# Altium footprint library CONN_HDR_1.27MM_ST.PcbLib: 116 footprints (part 6 of 9)
Each footprint in its own frame and in the unit in brackets; x right, y up, seen from the top. Pads: shape width x height; smd on the part's side, far side on the other; paste and mask are expansions set on the pad; w line width, h text height; cw(c..) or ccw(c..) is an arc to the next point about the centre after c.
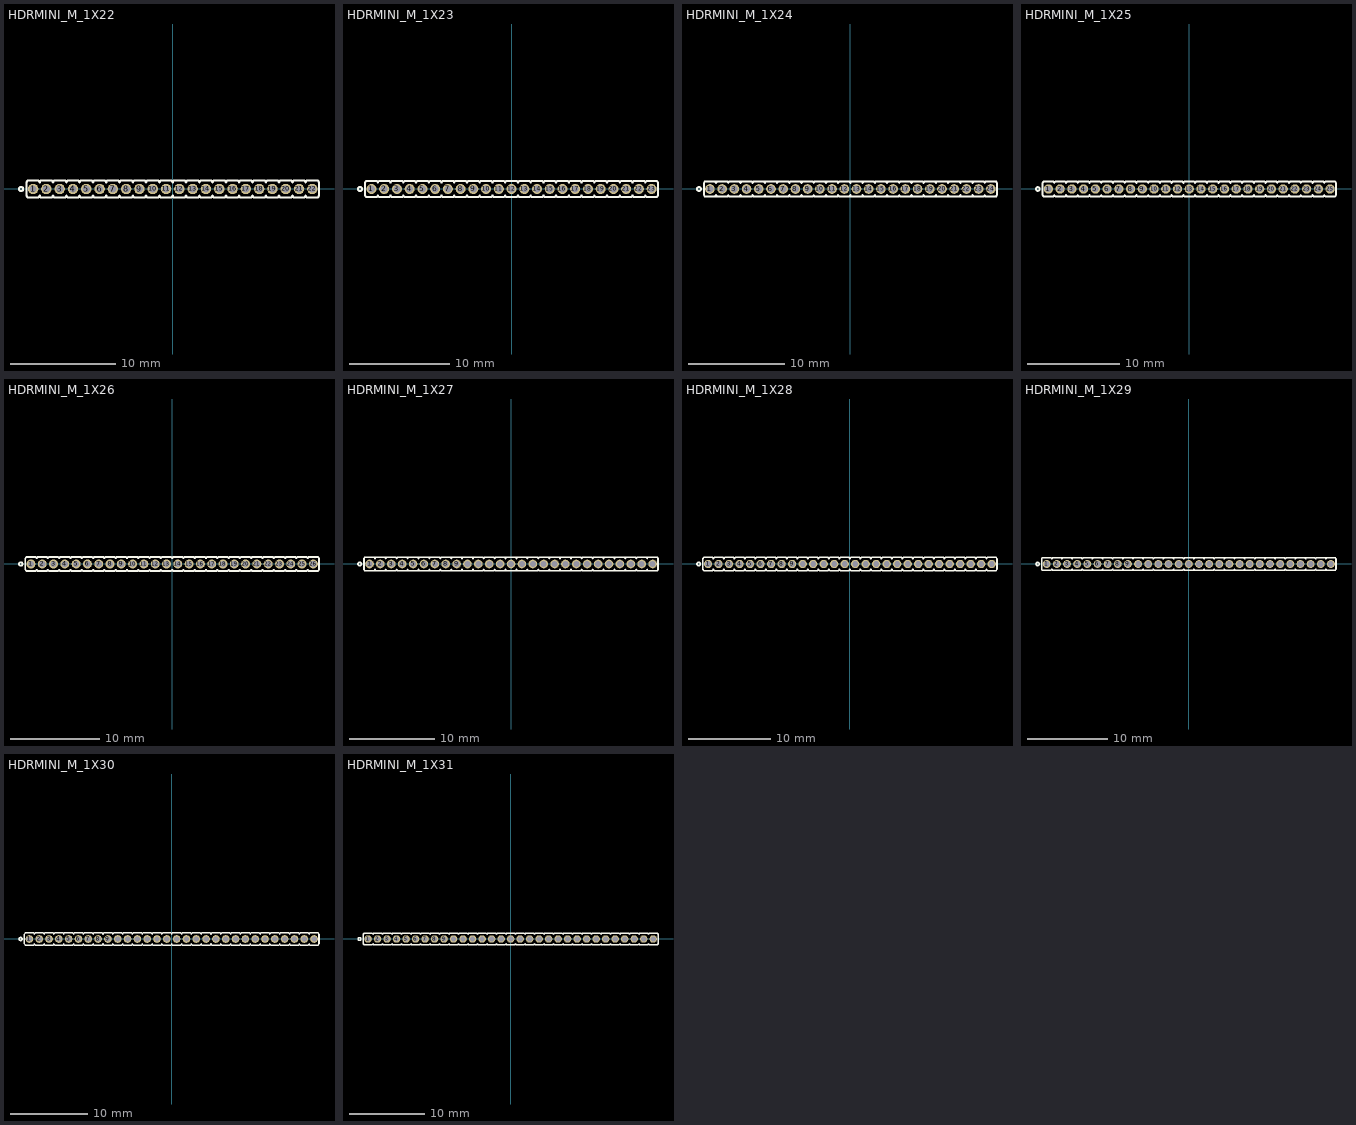
[diagram p5: the footprints below, top view; thin cyan lines are the x and y axes]

## HDRMINI_M_1X22 [mm] "mini header (50mil pitch)"
pads (22):
  round 1 / inner round 1 / far side oval 1x1.4 hole 0.7 mask+0.05: 1(-13.335,0) 2(-12.065,0) 3(-10.795,0) 4(-9.525,0) 5(-8.255,0) 6(-6.985,0) 7(-5.715,0) 8(-4.445,0) 9(-3.175,0) 10(-1.905,0) 11(-0.635,0) 12(0.635,0) 13(1.905,0) 14(3.175,0) 15(4.445,0) 16(5.715,0) 17(6.985,0) 18(8.255,0) 19(9.525,0) 20(10.795,0) 21(12.065,0) 22(13.335,0)
Top Overlay:
  circle w0.2: c-14.478,0 r0.2
  lines w0.2: 12.701,-0.635 12.602,-0.8 11.53,-0.8 11.431,-0.635 11.332,-0.8 10.26,-0.8 10.161,-0.635 10.062,-0.8 8.99,-0.8 8.891,-0.635 8.792,-0.8 7.72,-0.8 7.621,-0.635 7.522,-0.8 6.45,-0.8 6.351,-0.635 6.252,-0.8 5.18,-0.8 5.081,-0.635 4.982,-0.8 3.91,-0.8 3.811,-0.635 3.712,-0.8 2.64,-0.8 2.541,-0.635 2.442,-0.8 1.37,-0.8 1.271,-0.635 1.172,-0.8 0.1,-0.8 0.001,-0.635 -0.099,-0.8 -1.171,-0.8 -1.27,-0.635 -1.369,-0.8 -2.441,-0.8 -2.54,-0.635 -2.639,-0.8 -3.711,-0.8 -3.81,-0.635 -3.909,-0.8 -4.981,-0.8 -5.08,-0.635 -5.179,-0.8 -6.251,-0.8 -6.35,-0.635 -6.449,-0.8 -7.521,-0.8 -7.62,-0.635 -7.719,-0.8 -8.791,-0.8 -8.89,-0.635 -8.989,-0.8 -10.061,-0.8 -10.16,-0.635 -10.259,-0.8 -11.331,-0.8 -11.43,-0.635 -11.529,-0.8 -12.601,-0.8 -12.7,-0.635 -12.799,-0.8 -13.871,-0.8 -13.97,-0.635 -13.97,0.635 -13.871,0.8 -12.799,0.8 -12.7,0.635 -12.601,0.8 -11.529,0.8 -11.43,0.635 -11.331,0.8 -10.259,0.8 -10.16,0.635 -10.061,0.8 -8.989,0.8 -8.89,0.635 -8.791,0.8 -7.719,0.8 -7.62,0.635 -7.521,0.8 -6.449,0.8 -6.35,0.635 -6.251,0.8 -5.179,0.8 -5.08,0.635 -4.981,0.8 -3.909,0.8 -3.81,0.635 -3.711,0.8 -2.639,0.8 -2.54,0.635 -2.441,0.8 -1.369,0.8 -1.27,0.635 -1.171,0.8 -0.099,0.8 0,0.635 0.1,0.8 1.172,0.8 1.271,0.635 1.37,0.8 2.442,0.8 2.541,0.635 2.64,0.8 3.712,0.8 3.811,0.635 3.91,0.8 4.982,0.8 5.081,0.635 5.18,0.8 6.252,0.8 6.351,0.635 6.45,0.8 7.522,0.8 7.621,0.635 7.72,0.8 8.792,0.8 8.891,0.635 8.99,0.8 10.062,0.8 10.161,0.635 10.26,0.8 11.332,0.8 11.431,0.635 11.53,0.8 12.602,0.8 12.701,0.635 ; 12.701,-0.635 12.8,-0.8 13.872,-0.8 13.971,-0.635 13.971,0.635 13.872,0.8 12.8,0.8 12.701,0.635
3D body: height 2.8, standoff 0, extent -3.81,-0.635 -2.54,0.635
3D body: height 7.3, standoff -2.5, extent -3.375,-0.2 -2.975,0.2
3D body: height 2.8, standoff 0, extent -5.08,-0.635 -3.81,0.635
3D body: height 7.3, standoff -2.5, extent -4.645,-0.2 -4.245,0.2
3D body: height 2.8, standoff 0, extent -6.35,-0.635 -5.08,0.635
3D body: height 7.3, standoff -2.5, extent -5.915,-0.2 -5.515,0.2
3D body: height 2.8, standoff 0, extent -7.62,-0.635 -6.35,0.635
3D body: height 7.3, standoff -2.5, extent -7.185,-0.2 -6.785,0.2
3D body: height 2.8, standoff 0, extent -8.89,-0.635 -7.62,0.635
3D body: height 7.3, standoff -2.5, extent -8.455,-0.2 -8.055,0.2
3D body: height 2.8, standoff 0, extent -10.16,-0.635 -8.89,0.635
3D body: height 7.3, standoff -2.5, extent -9.725,-0.2 -9.325,0.2
3D body: height 2.8, standoff 0, extent -11.43,-0.635 -10.16,0.635
3D body: height 7.3, standoff -2.5, extent -10.995,-0.2 -10.595,0.2
3D body: height 2.8, standoff 0, extent -12.7,-0.635 -11.43,0.635
3D body: height 7.3, standoff -2.5, extent -12.265,-0.2 -11.865,0.2
3D body: height 2.8, standoff 0, extent -13.97,-0.635 -12.7,0.635
3D body: height 7.3, standoff -2.5, extent -13.535,-0.2 -13.135,0.2
3D body: height 2.8, standoff 0, extent -2.54,-0.635 -1.27,0.635
3D body: height 7.3, standoff -2.5, extent -2.105,-0.2 -1.705,0.2
3D body: height 2.8, standoff 0, extent 8.89,-0.635 10.16,0.635
3D body: height 7.3, standoff -2.5, extent 9.325,-0.2 9.725,0.2
3D body: height 2.8, standoff 0, extent 7.62,-0.635 8.89,0.635
3D body: height 7.3, standoff -2.5, extent 8.055,-0.2 8.455,0.2
3D body: height 2.8, standoff 0, extent 6.35,-0.635 7.62,0.635
3D body: height 7.3, standoff -2.5, extent 6.785,-0.2 7.185,0.2
3D body: height 2.8, standoff 0, extent 5.08,-0.635 6.35,0.635
3D body: height 7.3, standoff -2.5, extent 5.515,-0.2 5.915,0.2
3D body: height 2.8, standoff 0, extent 3.81,-0.635 5.08,0.635
3D body: height 7.3, standoff -2.5, extent 4.245,-0.2 4.645,0.2
3D body: height 2.8, standoff 0, extent 2.54,-0.635 3.81,0.635
3D body: height 7.3, standoff -2.5, extent 2.975,-0.2 3.375,0.2
3D body: height 2.8, standoff 0, extent 1.27,-0.635 2.54,0.635
3D body: height 7.3, standoff -2.5, extent 1.705,-0.2 2.105,0.2
3D body: height 2.8, standoff 0, extent 0,-0.635 1.27,0.635
3D body: height 7.3, standoff -2.5, extent 0.435,-0.2 0.835,0.2
3D body: height 2.8, standoff 0, extent -1.27,-0.635 0,0.635
3D body: height 7.3, standoff -2.5, extent -0.835,-0.2 -0.435,0.2
3D body: height 2.8, standoff 0, extent 10.16,-0.635 11.43,0.635
3D body: height 7.3, standoff -2.5, extent 10.595,-0.2 10.995,0.2
3D body: height 2.8, standoff 0, extent 12.7,-0.635 13.97,0.635
3D body: height 7.3, standoff -2.5, extent 13.135,-0.2 13.535,0.2
3D body: height 2.8, standoff 0, extent 11.43,-0.635 12.7,0.635
3D body: height 7.3, standoff -2.5, extent 11.865,-0.2 12.265,0.2

## HDRMINI_M_1X23 [mm] "mini header (50mil pitch)"
pads (23):
  round 1 / inner round 1 / far side oval 1x1.4 hole 0.7 mask+0.05: 1(-13.97,0) 2(-12.7,0) 3(-11.43,0) 4(-10.16,0) 5(-8.89,0) 6(-7.62,0) 7(-6.35,0) 8(-5.08,0) 9(-3.81,0) 10(-2.54,0) 11(-1.27,0) 12(0,0) 13(1.27,0) 14(2.54,0) 15(3.81,0) 16(5.08,0) 17(6.35,0) 18(7.62,0) 19(8.89,0) 20(10.16,0) 21(11.43,0) 22(12.7,0) 23(13.97,0)
Top Overlay:
  circle w0.2: c-15.113,0 r0.2
  lines w0.2: 12.066,-0.635 11.967,-0.8 10.895,-0.8 10.796,-0.635 10.697,-0.8 9.625,-0.8 9.526,-0.635 9.427,-0.8 8.355,-0.8 8.256,-0.635 8.157,-0.8 7.085,-0.8 6.986,-0.635 6.887,-0.8 5.815,-0.8 5.716,-0.635 5.617,-0.8 4.545,-0.8 4.446,-0.635 4.347,-0.8 3.275,-0.8 3.176,-0.635 3.077,-0.8 2.005,-0.8 1.906,-0.635 1.807,-0.8 0.735,-0.8 0.636,-0.635 0.537,-0.8 -0.535,-0.8 -0.634,-0.635 -0.734,-0.8 -1.806,-0.8 -1.905,-0.635 -2.004,-0.8 -3.076,-0.8 -3.175,-0.635 -3.274,-0.8 -4.346,-0.8 -4.445,-0.635 -4.544,-0.8 -5.616,-0.8 -5.715,-0.635 -5.814,-0.8 -6.886,-0.8 -6.985,-0.635 -7.084,-0.8 -8.156,-0.8 -8.255,-0.635 -8.354,-0.8 -9.426,-0.8 -9.525,-0.635 -9.624,-0.8 -10.696,-0.8 -10.795,-0.635 -10.894,-0.8 -11.966,-0.8 -12.065,-0.635 -12.164,-0.8 -13.236,-0.8 -13.335,-0.635 -13.434,-0.8 -14.506,-0.8 -14.605,-0.635 -14.605,0.635 -14.506,0.8 -13.434,0.8 -13.335,0.635 -13.236,0.8 -12.164,0.8 -12.065,0.635 -11.966,0.8 -10.894,0.8 -10.795,0.635 -10.696,0.8 -9.624,0.8 -9.525,0.635 -9.426,0.8 -8.354,0.8 -8.255,0.635 -8.156,0.8 -7.084,0.8 -6.985,0.635 -6.886,0.8 -5.814,0.8 -5.715,0.635 -5.616,0.8 -4.544,0.8 -4.445,0.635 -4.346,0.8 -3.274,0.8 -3.175,0.635 -3.076,0.8 -2.004,0.8 -1.905,0.635 -1.806,0.8 -0.734,0.8 -0.635,0.635 -0.535,0.8 0.537,0.8 0.636,0.635 0.735,0.8 1.807,0.8 1.906,0.635 2.005,0.8 3.077,0.8 3.176,0.635 3.275,0.8 4.347,0.8 4.446,0.635 4.545,0.8 5.617,0.8 5.716,0.635 5.815,0.8 6.887,0.8 6.986,0.635 7.085,0.8 8.157,0.8 8.256,0.635 8.355,0.8 9.427,0.8 9.526,0.635 9.625,0.8 10.697,0.8 10.796,0.635 10.895,0.8 11.967,0.8 12.066,0.635 ; 12.066,-0.635 12.165,-0.8 13.237,-0.8 13.336,-0.635 13.435,-0.8 14.507,-0.8 14.606,-0.635 14.606,0.635 14.507,0.8 13.435,0.8 13.336,0.635 13.237,0.8 12.165,0.8 12.066,0.635
3D body: height 2.8, standoff 0, extent -4.445,-0.635 -3.175,0.635
3D body: height 7.3, standoff -2.5, extent -4.01,-0.2 -3.61,0.2
3D body: height 2.8, standoff 0, extent -5.715,-0.635 -4.445,0.635
3D body: height 7.3, standoff -2.5, extent -5.28,-0.2 -4.88,0.2
3D body: height 2.8, standoff 0, extent -6.985,-0.635 -5.715,0.635
3D body: height 7.3, standoff -2.5, extent -6.55,-0.2 -6.15,0.2
3D body: height 2.8, standoff 0, extent -8.255,-0.635 -6.985,0.635
3D body: height 7.3, standoff -2.5, extent -7.82,-0.2 -7.42,0.2
3D body: height 2.8, standoff 0, extent -9.525,-0.635 -8.255,0.635
3D body: height 7.3, standoff -2.5, extent -9.09,-0.2 -8.69,0.2
3D body: height 2.8, standoff 0, extent -10.795,-0.635 -9.525,0.635
3D body: height 7.3, standoff -2.5, extent -10.36,-0.2 -9.96,0.2
3D body: height 2.8, standoff 0, extent -12.065,-0.635 -10.795,0.635
3D body: height 7.3, standoff -2.5, extent -11.63,-0.2 -11.23,0.2
3D body: height 2.8, standoff 0, extent -13.335,-0.635 -12.065,0.635
3D body: height 7.3, standoff -2.5, extent -12.9,-0.2 -12.5,0.2
3D body: height 2.8, standoff 0, extent -14.605,-0.635 -13.335,0.635
3D body: height 7.3, standoff -2.5, extent -14.17,-0.2 -13.77,0.2
3D body: height 2.8, standoff 0, extent -3.175,-0.635 -1.905,0.635
3D body: height 7.3, standoff -2.5, extent -2.74,-0.2 -2.34,0.2
3D body: height 2.8, standoff 0, extent 8.255,-0.635 9.525,0.635
3D body: height 7.3, standoff -2.5, extent 8.69,-0.2 9.09,0.2
3D body: height 2.8, standoff 0, extent 6.985,-0.635 8.255,0.635
3D body: height 7.3, standoff -2.5, extent 7.42,-0.2 7.82,0.2
3D body: height 2.8, standoff 0, extent 5.715,-0.635 6.985,0.635
3D body: height 7.3, standoff -2.5, extent 6.15,-0.2 6.55,0.2
3D body: height 2.8, standoff 0, extent 4.445,-0.635 5.715,0.635
3D body: height 7.3, standoff -2.5, extent 4.88,-0.2 5.28,0.2
3D body: height 2.8, standoff 0, extent 3.175,-0.635 4.445,0.635
3D body: height 7.3, standoff -2.5, extent 3.61,-0.2 4.01,0.2
3D body: height 2.8, standoff 0, extent 1.905,-0.635 3.175,0.635
3D body: height 7.3, standoff -2.5, extent 2.34,-0.2 2.74,0.2
3D body: height 2.8, standoff 0, extent 0.635,-0.635 1.905,0.635
3D body: height 7.3, standoff -2.5, extent 1.07,-0.2 1.47,0.2
3D body: height 2.8, standoff 0, extent -0.635,-0.635 0.635,0.635
3D body: height 7.3, standoff -2.5, extent -0.2,-0.2 0.2,0.2
3D body: height 2.8, standoff 0, extent -1.905,-0.635 -0.635,0.635
3D body: height 7.3, standoff -2.5, extent -1.47,-0.2 -1.07,0.2
3D body: height 2.8, standoff 0, extent 9.525,-0.635 10.795,0.635
3D body: height 7.3, standoff -2.5, extent 9.96,-0.2 10.36,0.2
3D body: height 2.8, standoff 0, extent 13.335,-0.635 14.605,0.635
3D body: height 7.3, standoff -2.5, extent 13.77,-0.2 14.17,0.2
3D body: height 2.8, standoff 0, extent 12.065,-0.635 13.335,0.635
3D body: height 7.3, standoff -2.5, extent 12.5,-0.2 12.9,0.2
3D body: height 2.8, standoff 0, extent 10.795,-0.635 12.065,0.635
3D body: height 7.3, standoff -2.5, extent 11.23,-0.2 11.63,0.2

## HDRMINI_M_1X24 [mm] "mini header (50mil pitch)"
pads (24):
  round 1 / inner round 1 / far side oval 1x1.4 hole 0.7 mask+0.05: 1(-14.605,0) 2(-13.335,0) 3(-12.065,0) 4(-10.795,0) 5(-9.525,0) 6(-8.255,0) 7(-6.985,0) 8(-5.715,0) 9(-4.445,0) 10(-3.175,0) 11(-1.905,0) 12(-0.635,0) 13(0.635,0) 14(1.905,0) 15(3.175,0) 16(4.445,0) 17(5.715,0) 18(6.985,0) 19(8.255,0) 20(9.525,0) 21(10.795,0) 22(12.065,0) 23(13.335,0) 24(14.605,0)
Top Overlay:
  circle w0.2: c-15.748,0 r0.2
  lines w0.2: 11.431,-0.635 11.332,-0.8 10.26,-0.8 10.161,-0.635 10.062,-0.8 8.99,-0.8 8.891,-0.635 8.792,-0.8 7.72,-0.8 7.621,-0.635 7.522,-0.8 6.45,-0.8 6.351,-0.635 6.252,-0.8 5.18,-0.8 5.081,-0.635 4.982,-0.8 3.91,-0.8 3.811,-0.635 3.712,-0.8 2.64,-0.8 2.541,-0.635 2.442,-0.8 1.37,-0.8 1.271,-0.635 1.172,-0.8 0.1,-0.8 0.001,-0.635 -0.098,-0.8 -1.17,-0.8 -1.269,-0.635 -1.369,-0.8 -2.441,-0.8 -2.54,-0.635 -2.639,-0.8 -3.711,-0.8 -3.81,-0.635 -3.909,-0.8 -4.981,-0.8 -5.08,-0.635 -5.179,-0.8 -6.251,-0.8 -6.35,-0.635 -6.449,-0.8 -7.521,-0.8 -7.62,-0.635 -7.719,-0.8 -8.791,-0.8 -8.89,-0.635 -8.989,-0.8 -10.061,-0.8 -10.16,-0.635 -10.259,-0.8 -11.331,-0.8 -11.43,-0.635 -11.529,-0.8 -12.601,-0.8 -12.7,-0.635 -12.799,-0.8 -13.871,-0.8 -13.97,-0.635 -14.069,-0.8 -15.141,-0.8 -15.24,-0.635 -15.24,0.635 -15.141,0.8 -14.069,0.8 -13.97,0.635 -13.871,0.8 -12.799,0.8 -12.7,0.635 -12.601,0.8 -11.529,0.8 -11.43,0.635 -11.331,0.8 -10.259,0.8 -10.16,0.635 -10.061,0.8 -8.989,0.8 -8.89,0.635 -8.791,0.8 -7.719,0.8 -7.62,0.635 -7.521,0.8 -6.449,0.8 -6.35,0.635 -6.251,0.8 -5.179,0.8 -5.08,0.635 -4.981,0.8 -3.909,0.8 -3.81,0.635 -3.711,0.8 -2.639,0.8 -2.54,0.635 -2.441,0.8 -1.369,0.8 -1.27,0.635 -1.17,0.8 -0.098,0.8 0.001,0.635 0.1,0.8 1.172,0.8 1.271,0.635 1.37,0.8 2.442,0.8 2.541,0.635 2.64,0.8 3.712,0.8 3.811,0.635 3.91,0.8 4.982,0.8 5.081,0.635 5.18,0.8 6.252,0.8 6.351,0.635 6.45,0.8 7.522,0.8 7.621,0.635 7.72,0.8 8.792,0.8 8.891,0.635 8.99,0.8 10.062,0.8 10.161,0.635 10.26,0.8 11.332,0.8 11.431,0.635 ; 11.431,-0.635 11.53,-0.8 12.602,-0.8 12.701,-0.635 12.8,-0.8 13.872,-0.8 13.971,-0.635 14.07,-0.8 15.142,-0.8 15.241,-0.635 15.241,0.635 15.142,0.8 14.07,0.8 13.971,0.635 13.872,0.8 12.8,0.8 12.701,0.635 12.602,0.8 11.53,0.8 11.431,0.635
3D body: height 2.8, standoff 0, extent -5.08,-0.635 -3.81,0.635
3D body: height 7.3, standoff -2.5, extent -4.645,-0.2 -4.245,0.2
3D body: height 2.8, standoff 0, extent -6.35,-0.635 -5.08,0.635
3D body: height 7.3, standoff -2.5, extent -5.915,-0.2 -5.515,0.2
3D body: height 2.8, standoff 0, extent -7.62,-0.635 -6.35,0.635
3D body: height 7.3, standoff -2.5, extent -7.185,-0.2 -6.785,0.2
3D body: height 2.8, standoff 0, extent -8.89,-0.635 -7.62,0.635
3D body: height 7.3, standoff -2.5, extent -8.455,-0.2 -8.055,0.2
3D body: height 2.8, standoff 0, extent -10.16,-0.635 -8.89,0.635
3D body: height 7.3, standoff -2.5, extent -9.725,-0.2 -9.325,0.2
3D body: height 2.8, standoff 0, extent -11.43,-0.635 -10.16,0.635
3D body: height 7.3, standoff -2.5, extent -10.995,-0.2 -10.595,0.2
3D body: height 2.8, standoff 0, extent -12.7,-0.635 -11.43,0.635
3D body: height 7.3, standoff -2.5, extent -12.265,-0.2 -11.865,0.2
3D body: height 2.8, standoff 0, extent -13.97,-0.635 -12.7,0.635
3D body: height 7.3, standoff -2.5, extent -13.535,-0.2 -13.135,0.2
3D body: height 2.8, standoff 0, extent -15.24,-0.635 -13.97,0.635
3D body: height 7.3, standoff -2.5, extent -14.805,-0.2 -14.405,0.2
3D body: height 2.8, standoff 0, extent -3.81,-0.635 -2.54,0.635
3D body: height 7.3, standoff -2.5, extent -3.375,-0.2 -2.975,0.2
3D body: height 2.8, standoff 0, extent 7.62,-0.635 8.89,0.635
3D body: height 7.3, standoff -2.5, extent 8.055,-0.2 8.455,0.2
3D body: height 2.8, standoff 0, extent 6.35,-0.635 7.62,0.635
3D body: height 7.3, standoff -2.5, extent 6.785,-0.2 7.185,0.2
3D body: height 2.8, standoff 0, extent 5.08,-0.635 6.35,0.635
3D body: height 7.3, standoff -2.5, extent 5.515,-0.2 5.915,0.2
3D body: height 2.8, standoff 0, extent 3.81,-0.635 5.08,0.635
3D body: height 7.3, standoff -2.5, extent 4.245,-0.2 4.645,0.2
3D body: height 2.8, standoff 0, extent 2.54,-0.635 3.81,0.635
3D body: height 7.3, standoff -2.5, extent 2.975,-0.2 3.375,0.2
3D body: height 2.8, standoff 0, extent 1.27,-0.635 2.54,0.635
3D body: height 7.3, standoff -2.5, extent 1.705,-0.2 2.105,0.2
3D body: height 2.8, standoff 0, extent 0,-0.635 1.27,0.635
3D body: height 7.3, standoff -2.5, extent 0.435,-0.2 0.835,0.2
3D body: height 2.8, standoff 0, extent -1.27,-0.635 0,0.635
3D body: height 7.3, standoff -2.5, extent -0.835,-0.2 -0.435,0.2
3D body: height 2.8, standoff 0, extent -2.54,-0.635 -1.27,0.635
3D body: height 7.3, standoff -2.5, extent -2.105,-0.2 -1.705,0.2
3D body: height 2.8, standoff 0, extent 8.89,-0.635 10.16,0.635
3D body: height 7.3, standoff -2.5, extent 9.325,-0.2 9.725,0.2
3D body: height 2.8, standoff 0, extent 13.97,-0.635 15.24,0.635
3D body: height 7.3, standoff -2.5, extent 14.405,-0.2 14.805,0.2
3D body: height 2.8, standoff 0, extent 12.7,-0.635 13.97,0.635
3D body: height 7.3, standoff -2.5, extent 13.135,-0.2 13.535,0.2
3D body: height 2.8, standoff 0, extent 11.43,-0.635 12.7,0.635
3D body: height 7.3, standoff -2.5, extent 11.865,-0.2 12.265,0.2
3D body: height 2.8, standoff 0, extent 10.16,-0.635 11.43,0.635
3D body: height 7.3, standoff -2.5, extent 10.595,-0.2 10.995,0.2

## HDRMINI_M_1X25 [mm] "mini header (50mil pitch)"
pads (25):
  round 1 / inner round 1 / far side oval 1x1.4 hole 0.7 mask+0.05: 1(-15.24,0) 2(-13.97,0) 3(-12.7,0) 4(-11.43,0) 5(-10.16,0) 6(-8.89,0) 7(-7.62,0) 8(-6.35,0) 9(-5.08,0) 10(-3.81,0) 11(-2.54,0) 12(-1.27,0) 13(0,0) 14(1.27,0) 15(2.54,0) 16(3.81,0) 17(5.08,0) 18(6.35,0) 19(7.62,0) 20(8.89,0) 21(10.16,0) 22(11.43,0) 23(12.7,0) 24(13.97,0) 25(15.24,0)
Top Overlay:
  drawing of 153 lines, arcs and shapes, not listed
3D body: height 2.8, standoff 0, extent -5.715,-0.635 -4.445,0.635
3D body: height 7.3, standoff -2.5, extent -5.28,-0.2 -4.88,0.2
3D body: height 2.8, standoff 0, extent -6.985,-0.635 -5.715,0.635
3D body: height 7.3, standoff -2.5, extent -6.55,-0.2 -6.15,0.2
3D body: height 2.8, standoff 0, extent -8.255,-0.635 -6.985,0.635
3D body: height 7.3, standoff -2.5, extent -7.82,-0.2 -7.42,0.2
3D body: height 2.8, standoff 0, extent -9.525,-0.635 -8.255,0.635
3D body: height 7.3, standoff -2.5, extent -9.09,-0.2 -8.69,0.2
3D body: height 2.8, standoff 0, extent -10.795,-0.635 -9.525,0.635
3D body: height 7.3, standoff -2.5, extent -10.36,-0.2 -9.96,0.2
3D body: height 2.8, standoff 0, extent -12.065,-0.635 -10.795,0.635
3D body: height 7.3, standoff -2.5, extent -11.63,-0.2 -11.23,0.2
3D body: height 2.8, standoff 0, extent -13.335,-0.635 -12.065,0.635
3D body: height 7.3, standoff -2.5, extent -12.9,-0.2 -12.5,0.2
3D body: height 2.8, standoff 0, extent -14.605,-0.635 -13.335,0.635
3D body: height 7.3, standoff -2.5, extent -14.17,-0.2 -13.77,0.2
3D body: height 2.8, standoff 0, extent -15.875,-0.635 -14.605,0.635
3D body: height 7.3, standoff -2.5, extent -15.44,-0.2 -15.04,0.2
3D body: height 2.8, standoff 0, extent -4.445,-0.635 -3.175,0.635
3D body: height 7.3, standoff -2.5, extent -4.01,-0.2 -3.61,0.2
3D body: height 2.8, standoff 0, extent 6.985,-0.635 8.255,0.635
3D body: height 7.3, standoff -2.5, extent 7.42,-0.2 7.82,0.2
3D body: height 2.8, standoff 0, extent 5.715,-0.635 6.985,0.635
3D body: height 7.3, standoff -2.5, extent 6.15,-0.2 6.55,0.2
3D body: height 2.8, standoff 0, extent 4.445,-0.635 5.715,0.635
3D body: height 7.3, standoff -2.5, extent 4.88,-0.2 5.28,0.2
3D body: height 2.8, standoff 0, extent 3.175,-0.635 4.445,0.635
3D body: height 7.3, standoff -2.5, extent 3.61,-0.2 4.01,0.2
3D body: height 2.8, standoff 0, extent 1.905,-0.635 3.175,0.635
3D body: height 7.3, standoff -2.5, extent 2.34,-0.2 2.74,0.2
3D body: height 2.8, standoff 0, extent 0.635,-0.635 1.905,0.635
3D body: height 7.3, standoff -2.5, extent 1.07,-0.2 1.47,0.2
3D body: height 2.8, standoff 0, extent -0.635,-0.635 0.635,0.635
3D body: height 7.3, standoff -2.5, extent -0.2,-0.2 0.2,0.2
3D body: height 2.8, standoff 0, extent -1.905,-0.635 -0.635,0.635
3D body: height 7.3, standoff -2.5, extent -1.47,-0.2 -1.07,0.2
3D body: height 2.8, standoff 0, extent -3.175,-0.635 -1.905,0.635
3D body: height 7.3, standoff -2.5, extent -2.74,-0.2 -2.34,0.2
3D body: height 2.8, standoff 0, extent 8.255,-0.635 9.525,0.635
3D body: height 7.3, standoff -2.5, extent 8.69,-0.2 9.09,0.2
3D body: height 2.8, standoff 0, extent 14.605,-0.635 15.875,0.635
3D body: height 7.3, standoff -2.5, extent 15.04,-0.2 15.44,0.2
3D body: height 2.8, standoff 0, extent 13.335,-0.635 14.605,0.635
3D body: height 7.3, standoff -2.5, extent 13.77,-0.2 14.17,0.2
3D body: height 2.8, standoff 0, extent 12.065,-0.635 13.335,0.635
3D body: height 7.3, standoff -2.5, extent 12.5,-0.2 12.9,0.2
3D body: height 2.8, standoff 0, extent 10.795,-0.635 12.065,0.635
3D body: height 7.3, standoff -2.5, extent 11.23,-0.2 11.63,0.2
3D body: height 2.8, standoff 0, extent 9.525,-0.635 10.795,0.635
3D body: height 7.3, standoff -2.5, extent 9.96,-0.2 10.36,0.2

## HDRMINI_M_1X26 [mm] "mini header (50mil pitch)"
pads (26):
  round 1 / inner round 1 / far side oval 1x1.4 hole 0.7 mask+0.05: 1(-15.875,0) 2(-14.605,0) 3(-13.335,0) 4(-12.065,0) 5(-10.795,0) 6(-9.525,0) 7(-8.255,0) 8(-6.985,0) 9(-5.715,0) 10(-4.445,0) 11(-3.175,0) 12(-1.905,0) 13(-0.635,0) 14(0.635,0) 15(1.905,0) 16(3.175,0) 17(4.445,0) 18(5.715,0) 19(6.985,0) 20(8.255,0) 21(9.525,0) 22(10.795,0) 23(12.065,0) 24(13.335,0) 25(14.605,0) 26(15.875,0)
Top Overlay:
  drawing of 159 lines, arcs and shapes, not listed
3D body: height 7.3, standoff -2.5, extent 9.325,-0.2 9.725,0.2
3D body: height 2.8, standoff 0, extent 8.89,-0.635 10.16,0.635
3D body: height 7.3, standoff -2.5, extent 10.595,-0.2 10.995,0.2
3D body: height 2.8, standoff 0, extent 10.16,-0.635 11.43,0.635
3D body: height 7.3, standoff -2.5, extent 11.865,-0.2 12.265,0.2
3D body: height 2.8, standoff 0, extent 11.43,-0.635 12.7,0.635
3D body: height 7.3, standoff -2.5, extent 13.135,-0.2 13.535,0.2
3D body: height 2.8, standoff 0, extent 12.7,-0.635 13.97,0.635
3D body: height 7.3, standoff -2.5, extent 14.405,-0.2 14.805,0.2
3D body: height 2.8, standoff 0, extent 13.97,-0.635 15.24,0.635
3D body: height 7.3, standoff -2.5, extent 15.675,-0.2 16.075,0.2
3D body: height 2.8, standoff 0, extent 15.24,-0.635 16.51,0.635
3D body: height 7.3, standoff -2.5, extent 8.055,-0.2 8.455,0.2
3D body: height 2.8, standoff 0, extent 7.62,-0.635 8.89,0.635
3D body: height 7.3, standoff -2.5, extent -3.375,-0.2 -2.975,0.2
3D body: height 2.8, standoff 0, extent -3.81,-0.635 -2.54,0.635
3D body: height 7.3, standoff -2.5, extent -2.105,-0.2 -1.705,0.2
3D body: height 2.8, standoff 0, extent -2.54,-0.635 -1.27,0.635
3D body: height 7.3, standoff -2.5, extent -0.835,-0.2 -0.435,0.2
3D body: height 2.8, standoff 0, extent -1.27,-0.635 0,0.635
3D body: height 7.3, standoff -2.5, extent 0.435,-0.2 0.835,0.2
3D body: height 2.8, standoff 0, extent 0,-0.635 1.27,0.635
3D body: height 7.3, standoff -2.5, extent 1.705,-0.2 2.105,0.2
3D body: height 2.8, standoff 0, extent 1.27,-0.635 2.54,0.635
3D body: height 7.3, standoff -2.5, extent 2.975,-0.2 3.375,0.2
3D body: height 2.8, standoff 0, extent 2.54,-0.635 3.81,0.635
3D body: height 7.3, standoff -2.5, extent 4.245,-0.2 4.645,0.2
3D body: height 2.8, standoff 0, extent 3.81,-0.635 5.08,0.635
3D body: height 7.3, standoff -2.5, extent 5.515,-0.2 5.915,0.2
3D body: height 2.8, standoff 0, extent 5.08,-0.635 6.35,0.635
3D body: height 7.3, standoff -2.5, extent 6.785,-0.2 7.185,0.2
3D body: height 2.8, standoff 0, extent 6.35,-0.635 7.62,0.635
3D body: height 7.3, standoff -2.5, extent -4.645,-0.2 -4.245,0.2
3D body: height 2.8, standoff 0, extent -5.08,-0.635 -3.81,0.635
3D body: height 7.3, standoff -2.5, extent -16.075,-0.2 -15.675,0.2
3D body: height 2.8, standoff 0, extent -16.51,-0.635 -15.24,0.635
3D body: height 7.3, standoff -2.5, extent -14.805,-0.2 -14.405,0.2
3D body: height 2.8, standoff 0, extent -15.24,-0.635 -13.97,0.635
3D body: height 7.3, standoff -2.5, extent -13.535,-0.2 -13.135,0.2
3D body: height 2.8, standoff 0, extent -13.97,-0.635 -12.7,0.635
3D body: height 7.3, standoff -2.5, extent -12.265,-0.2 -11.865,0.2
3D body: height 2.8, standoff 0, extent -12.7,-0.635 -11.43,0.635
3D body: height 7.3, standoff -2.5, extent -10.995,-0.2 -10.595,0.2
3D body: height 2.8, standoff 0, extent -11.43,-0.635 -10.16,0.635
3D body: height 7.3, standoff -2.5, extent -9.725,-0.2 -9.325,0.2
3D body: height 2.8, standoff 0, extent -10.16,-0.635 -8.89,0.635
3D body: height 7.3, standoff -2.5, extent -8.455,-0.2 -8.055,0.2
3D body: height 2.8, standoff 0, extent -8.89,-0.635 -7.62,0.635
3D body: height 7.3, standoff -2.5, extent -7.185,-0.2 -6.785,0.2
3D body: height 2.8, standoff 0, extent -7.62,-0.635 -6.35,0.635
3D body: height 7.3, standoff -2.5, extent -5.915,-0.2 -5.515,0.2
3D body: height 2.8, standoff 0, extent -6.35,-0.635 -5.08,0.635

## HDRMINI_M_1X27 [mm] "mini header (50mil pitch)"
pads (27):
  round 1 / inner round 1 / far side oval 1x1.4 hole 0.7 mask+0.05: 1(-16.51,0) 2(-15.24,0) 3(-13.97,0) 4(-12.7,0) 5(-11.43,0) 6(-10.16,0) 7(-8.89,0) 8(-7.62,0) 9(-6.35,0) 10(-5.08,0) 11(-3.81,0) 12(-2.54,0) 13(-1.27,0) 14(0,0) 15(1.27,0) 16(2.54,0) 17(3.81,0) 18(5.08,0) 19(6.35,0) 20(7.62,0) 21(8.89,0) 22(10.16,0) 23(11.43,0) 24(12.7,0) 25(13.97,0) 26(15.24,0) 27(16.51,0)
Top Overlay:
  drawing of 165 lines, arcs and shapes, not listed
3D body: height 2.8, standoff 0, extent -6.985,-0.635 -5.715,0.635
3D body: height 7.3, standoff -2.5, extent -6.55,-0.2 -6.15,0.2
3D body: height 2.8, standoff 0, extent -8.255,-0.635 -6.985,0.635
3D body: height 7.3, standoff -2.5, extent -7.82,-0.2 -7.42,0.2
3D body: height 2.8, standoff 0, extent -9.525,-0.635 -8.255,0.635
3D body: height 7.3, standoff -2.5, extent -9.09,-0.2 -8.69,0.2
3D body: height 2.8, standoff 0, extent -10.795,-0.635 -9.525,0.635
3D body: height 7.3, standoff -2.5, extent -10.36,-0.2 -9.96,0.2
3D body: height 2.8, standoff 0, extent -12.065,-0.635 -10.795,0.635
3D body: height 7.3, standoff -2.5, extent -11.63,-0.2 -11.23,0.2
3D body: height 2.8, standoff 0, extent -13.335,-0.635 -12.065,0.635
3D body: height 7.3, standoff -2.5, extent -12.9,-0.2 -12.5,0.2
3D body: height 2.8, standoff 0, extent -14.605,-0.635 -13.335,0.635
3D body: height 7.3, standoff -2.5, extent -14.17,-0.2 -13.77,0.2
3D body: height 2.8, standoff 0, extent -15.875,-0.635 -14.605,0.635
3D body: height 7.3, standoff -2.5, extent -15.44,-0.2 -15.04,0.2
3D body: height 2.8, standoff 0, extent -17.145,-0.635 -15.875,0.635
3D body: height 7.3, standoff -2.5, extent -16.71,-0.2 -16.31,0.2
3D body: height 2.8, standoff 0, extent -5.715,-0.635 -4.445,0.635
3D body: height 7.3, standoff -2.5, extent -5.28,-0.2 -4.88,0.2
3D body: height 2.8, standoff 0, extent 5.715,-0.635 6.985,0.635
3D body: height 7.3, standoff -2.5, extent 6.15,-0.2 6.55,0.2
3D body: height 2.8, standoff 0, extent 4.445,-0.635 5.715,0.635
3D body: height 7.3, standoff -2.5, extent 4.88,-0.2 5.28,0.2
3D body: height 2.8, standoff 0, extent 3.175,-0.635 4.445,0.635
3D body: height 7.3, standoff -2.5, extent 3.61,-0.2 4.01,0.2
3D body: height 2.8, standoff 0, extent 1.905,-0.635 3.175,0.635
3D body: height 7.3, standoff -2.5, extent 2.34,-0.2 2.74,0.2
3D body: height 2.8, standoff 0, extent 0.635,-0.635 1.905,0.635
3D body: height 7.3, standoff -2.5, extent 1.07,-0.2 1.47,0.2
3D body: height 2.8, standoff 0, extent -0.635,-0.635 0.635,0.635
3D body: height 7.3, standoff -2.5, extent -0.2,-0.2 0.2,0.2
3D body: height 2.8, standoff 0, extent -1.905,-0.635 -0.635,0.635
3D body: height 7.3, standoff -2.5, extent -1.47,-0.2 -1.07,0.2
3D body: height 2.8, standoff 0, extent -3.175,-0.635 -1.905,0.635
3D body: height 7.3, standoff -2.5, extent -2.74,-0.2 -2.34,0.2
3D body: height 2.8, standoff 0, extent -4.445,-0.635 -3.175,0.635
3D body: height 7.3, standoff -2.5, extent -4.01,-0.2 -3.61,0.2
3D body: height 2.8, standoff 0, extent 6.985,-0.635 8.255,0.635
3D body: height 7.3, standoff -2.5, extent 7.42,-0.2 7.82,0.2
3D body: height 2.8, standoff 0, extent 15.875,-0.635 17.145,0.635
3D body: height 7.3, standoff -2.5, extent 16.31,-0.2 16.71,0.2
3D body: height 2.8, standoff 0, extent 14.605,-0.635 15.875,0.635
3D body: height 7.3, standoff -2.5, extent 15.04,-0.2 15.44,0.2
3D body: height 2.8, standoff 0, extent 13.335,-0.635 14.605,0.635
3D body: height 7.3, standoff -2.5, extent 13.77,-0.2 14.17,0.2
3D body: height 2.8, standoff 0, extent 12.065,-0.635 13.335,0.635
3D body: height 7.3, standoff -2.5, extent 12.5,-0.2 12.9,0.2
3D body: height 2.8, standoff 0, extent 10.795,-0.635 12.065,0.635
3D body: height 7.3, standoff -2.5, extent 11.23,-0.2 11.63,0.2
3D body: height 2.8, standoff 0, extent 9.525,-0.635 10.795,0.635
3D body: height 7.3, standoff -2.5, extent 9.96,-0.2 10.36,0.2
3D body: height 2.8, standoff 0, extent 8.255,-0.635 9.525,0.635
3D body: height 7.3, standoff -2.5, extent 8.69,-0.2 9.09,0.2

## HDRMINI_M_1X28 [mm] "mini header (50mil pitch)"
pads (28):
  round 1 / inner round 1 / far side oval 1x1.4 hole 0.7 mask+0.05: 1(-17.145,0) 2(-15.875,0) 3(-14.605,0) 4(-13.335,0) 5(-12.065,0) 6(-10.795,0) 7(-9.525,0) 8(-8.255,0) 9(-6.985,0) 10(-5.715,0) 11(-4.445,0) 12(-3.175,0) 13(-1.905,0) 14(-0.635,0) 15(0.635,0) 16(1.905,0) 17(3.175,0) 18(4.445,0) 19(5.715,0) 20(6.985,0) 21(8.255,0) 22(9.525,0) 23(10.795,0) 24(12.065,0) 25(13.335,0) 26(14.605,0) 27(15.875,0) 28(17.145,0)
Top Overlay:
  drawing of 171 lines, arcs and shapes, not listed
3D body: height 2.8, standoff 0, extent -7.62,-0.635 -6.35,0.635
3D body: height 7.3, standoff -2.5, extent -7.185,-0.2 -6.785,0.2
3D body: height 2.8, standoff 0, extent -8.89,-0.635 -7.62,0.635
3D body: height 7.3, standoff -2.5, extent -8.455,-0.2 -8.055,0.2
3D body: height 2.8, standoff 0, extent -10.16,-0.635 -8.89,0.635
3D body: height 7.3, standoff -2.5, extent -9.725,-0.2 -9.325,0.2
3D body: height 2.8, standoff 0, extent -11.43,-0.635 -10.16,0.635
3D body: height 7.3, standoff -2.5, extent -10.995,-0.2 -10.595,0.2
3D body: height 2.8, standoff 0, extent -12.7,-0.635 -11.43,0.635
3D body: height 7.3, standoff -2.5, extent -12.265,-0.2 -11.865,0.2
3D body: height 2.8, standoff 0, extent -13.97,-0.635 -12.7,0.635
3D body: height 7.3, standoff -2.5, extent -13.535,-0.2 -13.135,0.2
3D body: height 2.8, standoff 0, extent -15.24,-0.635 -13.97,0.635
3D body: height 7.3, standoff -2.5, extent -14.805,-0.2 -14.405,0.2
3D body: height 2.8, standoff 0, extent -16.51,-0.635 -15.24,0.635
3D body: height 7.3, standoff -2.5, extent -16.075,-0.2 -15.675,0.2
3D body: height 2.8, standoff 0, extent -17.78,-0.635 -16.51,0.635
3D body: height 7.3, standoff -2.5, extent -17.345,-0.2 -16.945,0.2
3D body: height 2.8, standoff 0, extent -6.35,-0.635 -5.08,0.635
3D body: height 7.3, standoff -2.5, extent -5.915,-0.2 -5.515,0.2
3D body: height 2.8, standoff 0, extent 5.08,-0.635 6.35,0.635
3D body: height 7.3, standoff -2.5, extent 5.515,-0.2 5.915,0.2
3D body: height 2.8, standoff 0, extent 3.81,-0.635 5.08,0.635
3D body: height 7.3, standoff -2.5, extent 4.245,-0.2 4.645,0.2
3D body: height 2.8, standoff 0, extent 2.54,-0.635 3.81,0.635
3D body: height 7.3, standoff -2.5, extent 2.975,-0.2 3.375,0.2
3D body: height 2.8, standoff 0, extent 1.27,-0.635 2.54,0.635
3D body: height 7.3, standoff -2.5, extent 1.705,-0.2 2.105,0.2
3D body: height 2.8, standoff 0, extent 0,-0.635 1.27,0.635
3D body: height 7.3, standoff -2.5, extent 0.435,-0.2 0.835,0.2
3D body: height 2.8, standoff 0, extent -1.27,-0.635 0,0.635
3D body: height 7.3, standoff -2.5, extent -0.835,-0.2 -0.435,0.2
3D body: height 2.8, standoff 0, extent -2.54,-0.635 -1.27,0.635
3D body: height 7.3, standoff -2.5, extent -2.105,-0.2 -1.705,0.2
3D body: height 2.8, standoff 0, extent -3.81,-0.635 -2.54,0.635
3D body: height 7.3, standoff -2.5, extent -3.375,-0.2 -2.975,0.2
3D body: height 2.8, standoff 0, extent -5.08,-0.635 -3.81,0.635
3D body: height 7.3, standoff -2.5, extent -4.645,-0.2 -4.245,0.2
3D body: height 2.8, standoff 0, extent 6.35,-0.635 7.62,0.635
3D body: height 7.3, standoff -2.5, extent 6.785,-0.2 7.185,0.2
3D body: height 2.8, standoff 0, extent 16.51,-0.635 17.78,0.635
3D body: height 7.3, standoff -2.5, extent 16.945,-0.2 17.345,0.2
3D body: height 2.8, standoff 0, extent 15.24,-0.635 16.51,0.635
3D body: height 7.3, standoff -2.5, extent 15.675,-0.2 16.075,0.2
3D body: height 2.8, standoff 0, extent 13.97,-0.635 15.24,0.635
3D body: height 7.3, standoff -2.5, extent 14.405,-0.2 14.805,0.2
3D body: height 2.8, standoff 0, extent 12.7,-0.635 13.97,0.635
3D body: height 7.3, standoff -2.5, extent 13.135,-0.2 13.535,0.2
3D body: height 2.8, standoff 0, extent 11.43,-0.635 12.7,0.635
3D body: height 7.3, standoff -2.5, extent 11.865,-0.2 12.265,0.2
3D body: height 2.8, standoff 0, extent 10.16,-0.635 11.43,0.635
3D body: height 7.3, standoff -2.5, extent 10.595,-0.2 10.995,0.2
3D body: height 2.8, standoff 0, extent 8.89,-0.635 10.16,0.635
3D body: height 7.3, standoff -2.5, extent 9.325,-0.2 9.725,0.2
3D body: height 2.8, standoff 0, extent 7.62,-0.635 8.89,0.635
3D body: height 7.3, standoff -2.5, extent 8.055,-0.2 8.455,0.2

## HDRMINI_M_1X29 [mm] "mini header (50mil pitch)"
pads (29):
  round 1 / inner round 1 / far side oval 1x1.4 hole 0.7 mask+0.05: 1(-17.78,0) 2(-16.51,0) 3(-15.24,0) 4(-13.97,0) 5(-12.7,0) 6(-11.43,0) 7(-10.16,0) 8(-8.89,0) 9(-7.62,0) 10(-6.35,0) 11(-5.08,0) 12(-3.81,0) 13(-2.54,0) 14(-1.27,0) 15(0,0) 16(1.27,0) 17(2.54,0) 18(3.81,0) 19(5.08,0) 20(6.35,0) 21(7.62,0) 22(8.89,0) 23(10.16,0) 24(11.43,0) 25(12.7,0) 26(13.97,0) 27(15.24,0) 28(16.51,0) 29(17.78,0)
Top Overlay:
  drawing of 177 lines, arcs and shapes, not listed
3D body: height 2.8, standoff 0, extent -8.255,-0.635 -6.985,0.635
3D body: height 7.3, standoff -2.5, extent -7.82,-0.2 -7.42,0.2
3D body: height 2.8, standoff 0, extent -9.525,-0.635 -8.255,0.635
3D body: height 7.3, standoff -2.5, extent -9.09,-0.2 -8.69,0.2
3D body: height 2.8, standoff 0, extent -10.795,-0.635 -9.525,0.635
3D body: height 7.3, standoff -2.5, extent -10.36,-0.2 -9.96,0.2
3D body: height 2.8, standoff 0, extent -12.065,-0.635 -10.795,0.635
3D body: height 7.3, standoff -2.5, extent -11.63,-0.2 -11.23,0.2
3D body: height 2.8, standoff 0, extent -13.335,-0.635 -12.065,0.635
3D body: height 7.3, standoff -2.5, extent -12.9,-0.2 -12.5,0.2
3D body: height 2.8, standoff 0, extent -14.605,-0.635 -13.335,0.635
3D body: height 7.3, standoff -2.5, extent -14.17,-0.2 -13.77,0.2
3D body: height 2.8, standoff 0, extent -15.875,-0.635 -14.605,0.635
3D body: height 7.3, standoff -2.5, extent -15.44,-0.2 -15.04,0.2
3D body: height 2.8, standoff 0, extent -17.145,-0.635 -15.875,0.635
3D body: height 7.3, standoff -2.5, extent -16.71,-0.2 -16.31,0.2
3D body: height 2.8, standoff 0, extent -18.415,-0.635 -17.145,0.635
3D body: height 7.3, standoff -2.5, extent -17.98,-0.2 -17.58,0.2
3D body: height 2.8, standoff 0, extent -6.985,-0.635 -5.715,0.635
3D body: height 7.3, standoff -2.5, extent -6.55,-0.2 -6.15,0.2
3D body: height 2.8, standoff 0, extent 4.445,-0.635 5.715,0.635
3D body: height 7.3, standoff -2.5, extent 4.88,-0.2 5.28,0.2
3D body: height 2.8, standoff 0, extent 3.175,-0.635 4.445,0.635
3D body: height 7.3, standoff -2.5, extent 3.61,-0.2 4.01,0.2
3D body: height 2.8, standoff 0, extent 1.905,-0.635 3.175,0.635
3D body: height 7.3, standoff -2.5, extent 2.34,-0.2 2.74,0.2
3D body: height 2.8, standoff 0, extent 0.635,-0.635 1.905,0.635
3D body: height 7.3, standoff -2.5, extent 1.07,-0.2 1.47,0.2
3D body: height 2.8, standoff 0, extent -0.635,-0.635 0.635,0.635
3D body: height 7.3, standoff -2.5, extent -0.2,-0.2 0.2,0.2
3D body: height 2.8, standoff 0, extent -1.905,-0.635 -0.635,0.635
3D body: height 7.3, standoff -2.5, extent -1.47,-0.2 -1.07,0.2
3D body: height 2.8, standoff 0, extent -3.175,-0.635 -1.905,0.635
3D body: height 7.3, standoff -2.5, extent -2.74,-0.2 -2.34,0.2
3D body: height 2.8, standoff 0, extent -4.445,-0.635 -3.175,0.635
3D body: height 7.3, standoff -2.5, extent -4.01,-0.2 -3.61,0.2
3D body: height 2.8, standoff 0, extent -5.715,-0.635 -4.445,0.635
3D body: height 7.3, standoff -2.5, extent -5.28,-0.2 -4.88,0.2
3D body: height 2.8, standoff 0, extent 5.715,-0.635 6.985,0.635
3D body: height 7.3, standoff -2.5, extent 6.15,-0.2 6.55,0.2
3D body: height 2.8, standoff 0, extent 17.145,-0.635 18.415,0.635
3D body: height 7.3, standoff -2.5, extent 17.58,-0.2 17.98,0.2
3D body: height 2.8, standoff 0, extent 15.875,-0.635 17.145,0.635
3D body: height 7.3, standoff -2.5, extent 16.31,-0.2 16.71,0.2
3D body: height 2.8, standoff 0, extent 14.605,-0.635 15.875,0.635
3D body: height 7.3, standoff -2.5, extent 15.04,-0.2 15.44,0.2
3D body: height 2.8, standoff 0, extent 13.335,-0.635 14.605,0.635
3D body: height 7.3, standoff -2.5, extent 13.77,-0.2 14.17,0.2
3D body: height 2.8, standoff 0, extent 12.065,-0.635 13.335,0.635
3D body: height 7.3, standoff -2.5, extent 12.5,-0.2 12.9,0.2
3D body: height 2.8, standoff 0, extent 10.795,-0.635 12.065,0.635
3D body: height 7.3, standoff -2.5, extent 11.23,-0.2 11.63,0.2
3D body: height 2.8, standoff 0, extent 9.525,-0.635 10.795,0.635
3D body: height 7.3, standoff -2.5, extent 9.96,-0.2 10.36,0.2
3D body: height 2.8, standoff 0, extent 8.255,-0.635 9.525,0.635
3D body: height 7.3, standoff -2.5, extent 8.69,-0.2 9.09,0.2
3D body: height 2.8, standoff 0, extent 6.985,-0.635 8.255,0.635
3D body: height 7.3, standoff -2.5, extent 7.42,-0.2 7.82,0.2

## HDRMINI_M_1X30 [mm] "mini header (50mil pitch)"
pads (30):
  round 1 / inner round 1 / far side oval 1x1.4 hole 0.7 mask+0.05: 1(-18.415,0) 2(-17.145,0) 3(-15.875,0) 4(-14.605,0) 5(-13.335,0) 6(-12.065,0) 7(-10.795,0) 8(-9.525,0) 9(-8.255,0) 10(-6.985,0) 11(-5.715,0) 12(-4.445,0) 13(-3.175,0) 14(-1.905,0) 15(-0.635,0) 16(0.635,0) 17(1.905,0) 18(3.175,0) 19(4.445,0) 20(5.715,0) 21(6.985,0) 22(8.255,0) 23(9.525,0) 24(10.795,0) 25(12.065,0) 26(13.335,0) 27(14.605,0) 28(15.875,0) 29(17.145,0) 30(18.415,0)
Top Overlay:
  drawing of 183 lines, arcs and shapes, not listed
3D body: height 2.8, standoff 0, extent -8.89,-0.635 -7.62,0.635
3D body: height 7.3, standoff -2.5, extent -8.455,-0.2 -8.055,0.2
3D body: height 2.8, standoff 0, extent -10.16,-0.635 -8.89,0.635
3D body: height 7.3, standoff -2.5, extent -9.725,-0.2 -9.325,0.2
3D body: height 2.8, standoff 0, extent -11.43,-0.635 -10.16,0.635
3D body: height 7.3, standoff -2.5, extent -10.995,-0.2 -10.595,0.2
3D body: height 2.8, standoff 0, extent -12.7,-0.635 -11.43,0.635
3D body: height 7.3, standoff -2.5, extent -12.265,-0.2 -11.865,0.2
3D body: height 2.8, standoff 0, extent -13.97,-0.635 -12.7,0.635
3D body: height 7.3, standoff -2.5, extent -13.535,-0.2 -13.135,0.2
3D body: height 2.8, standoff 0, extent -15.24,-0.635 -13.97,0.635
3D body: height 7.3, standoff -2.5, extent -14.805,-0.2 -14.405,0.2
3D body: height 2.8, standoff 0, extent -16.51,-0.635 -15.24,0.635
3D body: height 7.3, standoff -2.5, extent -16.075,-0.2 -15.675,0.2
3D body: height 2.8, standoff 0, extent -17.78,-0.635 -16.51,0.635
3D body: height 7.3, standoff -2.5, extent -17.345,-0.2 -16.945,0.2
3D body: height 2.8, standoff 0, extent -19.05,-0.635 -17.78,0.635
3D body: height 7.3, standoff -2.5, extent -18.615,-0.2 -18.215,0.2
3D body: height 2.8, standoff 0, extent -7.62,-0.635 -6.35,0.635
3D body: height 7.3, standoff -2.5, extent -7.185,-0.2 -6.785,0.2
3D body: height 2.8, standoff 0, extent 3.81,-0.635 5.08,0.635
3D body: height 7.3, standoff -2.5, extent 4.245,-0.2 4.645,0.2
3D body: height 2.8, standoff 0, extent 2.54,-0.635 3.81,0.635
3D body: height 7.3, standoff -2.5, extent 2.975,-0.2 3.375,0.2
3D body: height 2.8, standoff 0, extent 1.27,-0.635 2.54,0.635
3D body: height 7.3, standoff -2.5, extent 1.705,-0.2 2.105,0.2
3D body: height 2.8, standoff 0, extent 0,-0.635 1.27,0.635
3D body: height 7.3, standoff -2.5, extent 0.435,-0.2 0.835,0.2
3D body: height 2.8, standoff 0, extent -1.27,-0.635 0,0.635
3D body: height 7.3, standoff -2.5, extent -0.835,-0.2 -0.435,0.2
3D body: height 2.8, standoff 0, extent -2.54,-0.635 -1.27,0.635
3D body: height 7.3, standoff -2.5, extent -2.105,-0.2 -1.705,0.2
3D body: height 2.8, standoff 0, extent -3.81,-0.635 -2.54,0.635
3D body: height 7.3, standoff -2.5, extent -3.375,-0.2 -2.975,0.2
3D body: height 2.8, standoff 0, extent -5.08,-0.635 -3.81,0.635
3D body: height 7.3, standoff -2.5, extent -4.645,-0.2 -4.245,0.2
3D body: height 2.8, standoff 0, extent -6.35,-0.635 -5.08,0.635
3D body: height 7.3, standoff -2.5, extent -5.915,-0.2 -5.515,0.2
3D body: height 2.8, standoff 0, extent 5.08,-0.635 6.35,0.635
3D body: height 7.3, standoff -2.5, extent 5.515,-0.2 5.915,0.2
3D body: height 2.8, standoff 0, extent 16.51,-0.635 17.78,0.635
3D body: height 7.3, standoff -2.5, extent 16.945,-0.2 17.345,0.2
3D body: height 2.8, standoff 0, extent 15.24,-0.635 16.51,0.635
3D body: height 7.3, standoff -2.5, extent 15.675,-0.2 16.075,0.2
3D body: height 2.8, standoff 0, extent 13.97,-0.635 15.24,0.635
3D body: height 7.3, standoff -2.5, extent 14.405,-0.2 14.805,0.2
3D body: height 2.8, standoff 0, extent 12.7,-0.635 13.97,0.635
3D body: height 7.3, standoff -2.5, extent 13.135,-0.2 13.535,0.2
3D body: height 2.8, standoff 0, extent 11.43,-0.635 12.7,0.635
3D body: height 7.3, standoff -2.5, extent 11.865,-0.2 12.265,0.2
3D body: height 2.8, standoff 0, extent 10.16,-0.635 11.43,0.635
3D body: height 7.3, standoff -2.5, extent 10.595,-0.2 10.995,0.2
3D body: height 2.8, standoff 0, extent 8.89,-0.635 10.16,0.635
3D body: height 7.3, standoff -2.5, extent 9.325,-0.2 9.725,0.2
3D body: height 2.8, standoff 0, extent 7.62,-0.635 8.89,0.635
3D body: height 7.3, standoff -2.5, extent 8.055,-0.2 8.455,0.2
3D body: height 2.8, standoff 0, extent 6.35,-0.635 7.62,0.635
3D body: height 7.3, standoff -2.5, extent 6.785,-0.2 7.185,0.2
3D body: height 2.8, standoff 0, extent 17.78,-0.635 19.05,0.635
3D body: height 7.3, standoff -2.5, extent 18.215,-0.2 18.615,0.2

## HDRMINI_M_1X31 [mm] "mini header (50mil pitch)"
pads (31):
  round 1 / inner round 1 / far side oval 1x1.4 hole 0.7 mask+0.05: 1(-19.05,0) 2(-17.78,0) 3(-16.51,0) 4(-15.24,0) 5(-13.97,0) 6(-12.7,0) 7(-11.43,0) 8(-10.16,0) 9(-8.89,0) 10(-7.62,0) 11(-6.35,0) 12(-5.08,0) 13(-3.81,0) 14(-2.54,0) 15(-1.27,0) 16(0,0) 17(1.27,0) 18(2.54,0) 19(3.81,0) 20(5.08,0) 21(6.35,0) 22(7.62,0) 23(8.89,0) 24(10.16,0) 25(11.43,0) 26(12.7,0) 27(13.97,0) 28(15.24,0) 29(16.51,0) 30(17.78,0) 31(19.05,0)
Top Overlay:
  drawing of 189 lines, arcs and shapes, not listed
3D body: height 2.8, standoff 0, extent -9.525,-0.635 -8.255,0.635
3D body: height 7.3, standoff -2.5, extent -9.09,-0.2 -8.69,0.2
3D body: height 2.8, standoff 0, extent -10.795,-0.635 -9.525,0.635
3D body: height 7.3, standoff -2.5, extent -10.36,-0.2 -9.96,0.2
3D body: height 2.8, standoff 0, extent -12.065,-0.635 -10.795,0.635
3D body: height 7.3, standoff -2.5, extent -11.63,-0.2 -11.23,0.2
3D body: height 2.8, standoff 0, extent -13.335,-0.635 -12.065,0.635
3D body: height 7.3, standoff -2.5, extent -12.9,-0.2 -12.5,0.2
3D body: height 2.8, standoff 0, extent -14.605,-0.635 -13.335,0.635
3D body: height 7.3, standoff -2.5, extent -14.17,-0.2 -13.77,0.2
3D body: height 2.8, standoff 0, extent -15.875,-0.635 -14.605,0.635
3D body: height 7.3, standoff -2.5, extent -15.44,-0.2 -15.04,0.2
3D body: height 2.8, standoff 0, extent -17.145,-0.635 -15.875,0.635
3D body: height 7.3, standoff -2.5, extent -16.71,-0.2 -16.31,0.2
3D body: height 2.8, standoff 0, extent -18.415,-0.635 -17.145,0.635
3D body: height 7.3, standoff -2.5, extent -17.98,-0.2 -17.58,0.2
3D body: height 2.8, standoff 0, extent -19.685,-0.635 -18.415,0.635
3D body: height 7.3, standoff -2.5, extent -19.25,-0.2 -18.85,0.2
3D body: height 2.8, standoff 0, extent -8.255,-0.635 -6.985,0.635
3D body: height 7.3, standoff -2.5, extent -7.82,-0.2 -7.42,0.2
3D body: height 2.8, standoff 0, extent 3.175,-0.635 4.445,0.635
3D body: height 7.3, standoff -2.5, extent 3.61,-0.2 4.01,0.2
3D body: height 2.8, standoff 0, extent 1.905,-0.635 3.175,0.635
3D body: height 7.3, standoff -2.5, extent 2.34,-0.2 2.74,0.2
3D body: height 2.8, standoff 0, extent 0.635,-0.635 1.905,0.635
3D body: height 7.3, standoff -2.5, extent 1.07,-0.2 1.47,0.2
3D body: height 2.8, standoff 0, extent -0.635,-0.635 0.635,0.635
3D body: height 7.3, standoff -2.5, extent -0.2,-0.2 0.2,0.2
3D body: height 2.8, standoff 0, extent -1.905,-0.635 -0.635,0.635
3D body: height 7.3, standoff -2.5, extent -1.47,-0.2 -1.07,0.2
3D body: height 2.8, standoff 0, extent -3.175,-0.635 -1.905,0.635
3D body: height 7.3, standoff -2.5, extent -2.74,-0.2 -2.34,0.2
3D body: height 2.8, standoff 0, extent -4.445,-0.635 -3.175,0.635
3D body: height 7.3, standoff -2.5, extent -4.01,-0.2 -3.61,0.2
3D body: height 2.8, standoff 0, extent -5.715,-0.635 -4.445,0.635
3D body: height 7.3, standoff -2.5, extent -5.28,-0.2 -4.88,0.2
3D body: height 2.8, standoff 0, extent -6.985,-0.635 -5.715,0.635
3D body: height 7.3, standoff -2.5, extent -6.55,-0.2 -6.15,0.2
3D body: height 2.8, standoff 0, extent 4.445,-0.635 5.715,0.635
3D body: height 7.3, standoff -2.5, extent 4.88,-0.2 5.28,0.2
3D body: height 2.8, standoff 0, extent 15.875,-0.635 17.145,0.635
3D body: height 7.3, standoff -2.5, extent 16.31,-0.2 16.71,0.2
3D body: height 2.8, standoff 0, extent 14.605,-0.635 15.875,0.635
3D body: height 7.3, standoff -2.5, extent 15.04,-0.2 15.44,0.2
3D body: height 2.8, standoff 0, extent 13.335,-0.635 14.605,0.635
3D body: height 7.3, standoff -2.5, extent 13.77,-0.2 14.17,0.2
3D body: height 2.8, standoff 0, extent 12.065,-0.635 13.335,0.635
3D body: height 7.3, standoff -2.5, extent 12.5,-0.2 12.9,0.2
3D body: height 2.8, standoff 0, extent 10.795,-0.635 12.065,0.635
3D body: height 7.3, standoff -2.5, extent 11.23,-0.2 11.63,0.2
3D body: height 2.8, standoff 0, extent 9.525,-0.635 10.795,0.635
3D body: height 7.3, standoff -2.5, extent 9.96,-0.2 10.36,0.2
3D body: height 2.8, standoff 0, extent 8.255,-0.635 9.525,0.635
3D body: height 7.3, standoff -2.5, extent 8.69,-0.2 9.09,0.2
3D body: height 2.8, standoff 0, extent 6.985,-0.635 8.255,0.635
3D body: height 7.3, standoff -2.5, extent 7.42,-0.2 7.82,0.2
3D body: height 2.8, standoff 0, extent 5.715,-0.635 6.985,0.635
3D body: height 7.3, standoff -2.5, extent 6.15,-0.2 6.55,0.2
3D body: height 2.8, standoff 0, extent 17.145,-0.635 18.415,0.635
3D body: height 7.3, standoff -2.5, extent 17.58,-0.2 17.98,0.2
3D body: height 2.8, standoff 0, extent 18.415,-0.635 19.685,0.635
3D body: height 7.3, standoff -2.5, extent 18.85,-0.2 19.25,0.2